# Altium footprint library General.PCBLIB: 231 footprints (part 12 of 15)
Each footprint in its own frame and in the unit in brackets; x right, y up, seen from the top. Pads: shape width x height; smd on the part's side, far side on the other; paste and mask are expansions set on the pad; w line width, h text height; cw(c..) or ccw(c..) is an arc to the next point about the centre after c.
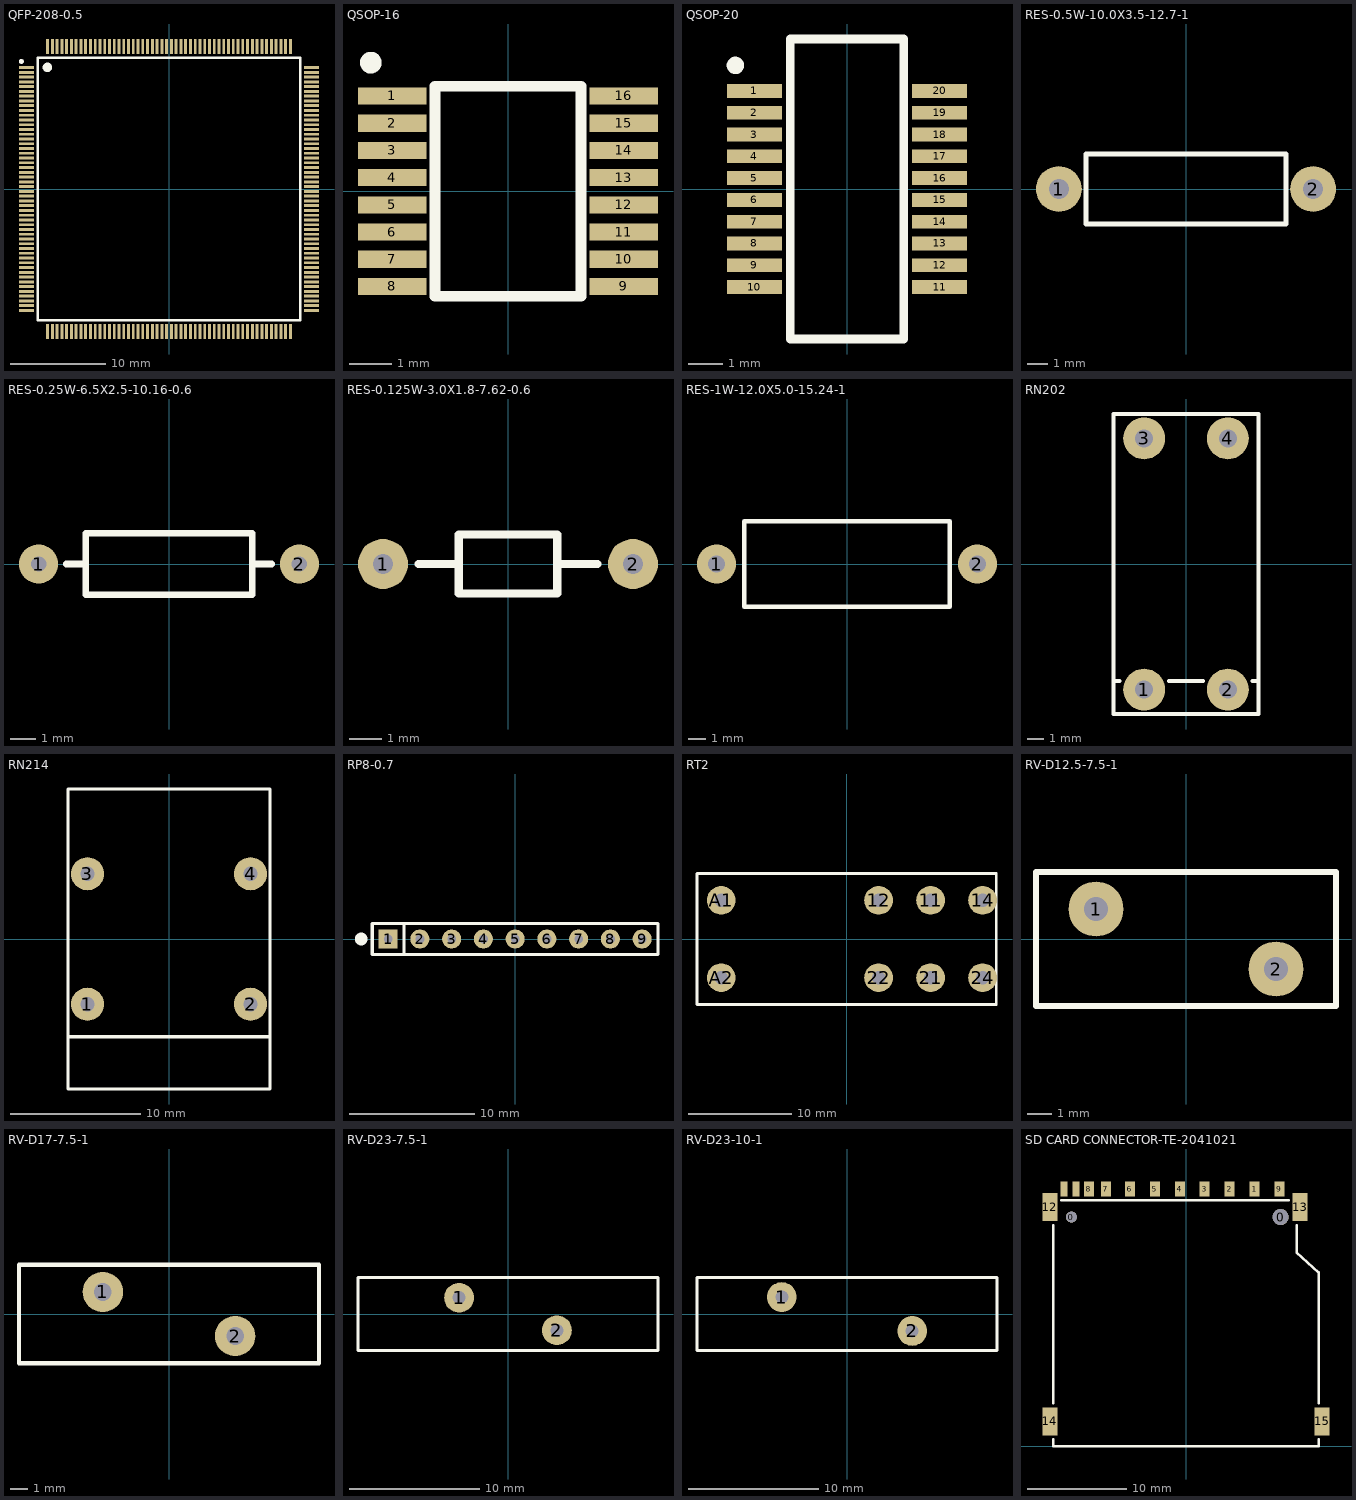
[diagram p11: the footprints below, top view; thin cyan lines are the x and y axes]

## QFP-208-0.5 [mm] "QFP-208"
height 4.1
pads (208):
  rect 1.6x0.3 smd: 1(-14.95,12.75) 2(-14.95,12.25) 3(-14.95,11.75) 4(-14.95,11.25) 5(-14.95,10.75) 6(-14.95,10.25) 7(-14.95,9.75) 8(-14.95,9.25) 9(-14.95,8.75) 10(-14.95,8.25) 11(-14.95,7.75) 12(-14.95,7.25) 13(-14.95,6.75) 14(-14.95,6.25) 15(-14.95,5.75) 16(-14.95,5.25) 17(-14.95,4.75) 18(-14.95,4.25) 19(-14.95,3.75) 20(-14.95,3.25) 21(-14.95,2.75) 22(-14.95,2.25) 23(-14.95,1.75) 24(-14.95,1.25) 25(-14.95,0.75) 26(-14.95,0.25) 27(-14.95,-0.25) 28(-14.95,-0.75) 29(-14.95,-1.25) 30(-14.95,-1.75) 31(-14.95,-2.25) 32(-14.95,-2.75) 33(-14.95,-3.25) 34(-14.95,-3.75) 35(-14.95,-4.25) 36(-14.95,-4.75) 37(-14.95,-5.25) 38(-14.95,-5.75) 39(-14.95,-6.25) 40(-14.95,-6.75) 41(-14.95,-7.25) 42(-14.95,-7.75) 43(-14.95,-8.25) 44(-14.95,-8.75) 45(-14.95,-9.25) 46(-14.95,-9.75) 47(-14.95,-10.25) 48(-14.95,-10.75) 49(-14.95,-11.25) 50(-14.95,-11.75) 51(-14.95,-12.25) 52(-14.95,-12.75) 105(14.95,-12.75) 106(14.95,-12.25) 107(14.95,-11.75) 108(14.95,-11.25) 109(14.95,-10.75) 110(14.95,-10.25) 111(14.95,-9.75) 112(14.95,-9.25) 113(14.95,-8.75) 114(14.95,-8.25) 115(14.95,-7.75) 116(14.95,-7.25) 117(14.95,-6.75) 118(14.95,-6.25) 119(14.95,-5.75) 120(14.95,-5.25) 121(14.95,-4.75) 122(14.95,-4.25) 123(14.95,-3.75) 124(14.95,-3.25) 125(14.95,-2.75) 126(14.95,-2.25) 127(14.95,-1.75) 128(14.95,-1.25) 129(14.95,-0.75) 130(14.95,-0.25) 131(14.95,0.25) 132(14.95,0.75) 133(14.95,1.25) 134(14.95,1.75) 135(14.95,2.25) 136(14.95,2.75) 137(14.95,3.25) 138(14.95,3.75) 139(14.95,4.25) 140(14.95,4.75) 141(14.95,5.25) 142(14.95,5.75) 143(14.95,6.25) 144(14.95,6.75) 145(14.95,7.25) 146(14.95,7.75) 147(14.95,8.25) 148(14.95,8.75) 149(14.95,9.25) 150(14.95,9.75) 151(14.95,10.25) 152(14.95,10.75) 153(14.95,11.25) 154(14.95,11.75) 155(14.95,12.25) 156(14.95,12.75)
  rect 0.3x1.6 smd: 53(-12.75,-14.95) 54(-12.25,-14.95) 55(-11.75,-14.95) 56(-11.25,-14.95) 57(-10.75,-14.95) 58(-10.25,-14.95) 59(-9.75,-14.95) 60(-9.25,-14.95) 61(-8.75,-14.95) 62(-8.25,-14.95) 63(-7.75,-14.95) 64(-7.25,-14.95) 65(-6.75,-14.95) 66(-6.25,-14.95) 67(-5.75,-14.95) 68(-5.25,-14.95) 69(-4.75,-14.95) 70(-4.25,-14.95) 71(-3.75,-14.95) 72(-3.25,-14.95) 73(-2.75,-14.95) 74(-2.25,-14.95) 75(-1.75,-14.95) 76(-1.25,-14.95) 77(-0.75,-14.95) 78(-0.25,-14.95) 79(0.25,-14.95) 80(0.75,-14.95) 81(1.25,-14.95) 82(1.75,-14.95) 83(2.25,-14.95) 84(2.75,-14.95) 85(3.25,-14.95) 86(3.75,-14.95) 87(4.25,-14.95) 88(4.75,-14.95) 89(5.25,-14.95) 90(5.75,-14.95) 91(6.25,-14.95) 92(6.75,-14.95) 93(7.25,-14.95) 94(7.75,-14.95) 95(8.25,-14.95) 96(8.75,-14.95) 97(9.25,-14.95) 98(9.75,-14.95) 99(10.25,-14.95) 100(10.75,-14.95) 101(11.25,-14.95) 102(11.75,-14.95) 103(12.25,-14.95) 104(12.75,-14.95) 157(12.75,14.95) 158(12.25,14.95) 159(11.75,14.95) 160(11.25,14.95) 161(10.75,14.95) 162(10.25,14.95) 163(9.75,14.95) 164(9.25,14.95) 165(8.75,14.95) 166(8.25,14.95) 167(7.75,14.95) 168(7.25,14.95) 169(6.75,14.95) 170(6.25,14.95) 171(5.75,14.95) 172(5.25,14.95) 173(4.75,14.95) 174(4.25,14.95) 175(3.75,14.95) 176(3.25,14.95) 177(2.75,14.95) 178(2.25,14.95) 179(1.75,14.95) 180(1.25,14.95) 181(0.75,14.95) 182(0.25,14.95) 183(-0.25,14.95) 184(-0.75,14.95) 185(-1.25,14.95) 186(-1.75,14.95) 187(-2.25,14.95) 188(-2.75,14.95) 189(-3.25,14.95) 190(-3.75,14.95) 191(-4.25,14.95) 192(-4.75,14.95) 193(-5.25,14.95) 194(-5.75,14.95) 195(-6.25,14.95) 196(-6.75,14.95) 197(-7.25,14.95) 198(-7.75,14.95) 199(-8.25,14.95) 200(-8.75,14.95) 201(-9.25,14.95) 202(-9.75,14.95) 203(-10.25,14.95) 204(-10.75,14.95) 205(-11.25,14.95) 206(-11.75,14.95) 207(-12.25,14.95) 208(-12.75,14.95)
Top Overlay:
  circle w0.254: c-15.5,13.4 r0.127
  circle w0.5: c-12.77,12.77 r0.25
  lines w0.254: -13.77,-13.77 13.77,-13.77 13.77,13.77 -13.77,13.77 -13.77,-13.77
3D body "QFP50P3060X3060X410-208N.STEP": height 4.25, standoff 0, extent -15.315,-15.315 15.313,15.313

## QSOP-16 [mm] "QSOP, 16PIN"
height 1.75
pads (16):
  rect 1.6x0.4 smd: 1(-2.7,2.222) 2(-2.7,1.587) 3(-2.7,0.953) 4(-2.7,0.318) 5(-2.7,-0.318) 6(-2.7,-0.953) 7(-2.7,-1.587) 8(-2.7,-2.222) 9(2.7,-2.222) 10(2.7,-1.587) 11(2.7,-0.953) 12(2.7,-0.318) 13(2.7,0.318) 14(2.7,0.953) 15(2.7,1.587) 16(2.7,2.222)
Top Overlay:
  circle w0.254: c-3.2,3 r0.127
  lines w0.254: -1.7,-2.45 -1.7,2.45 1.7,2.45 1.7,-2.45 -1.7,-2.45
3D body "SOP63P602X173-16N_MO-137AB_QSOP.step": height 1.88, standoff 0, extent -3.038,-2.5 3.038,2.5

## QSOP-20 [mm] "QSOP, 20PIN"
height 1.75
pads (20):
  rect 1.6x0.4 smd: 1(-2.7,2.857) 2(-2.7,2.222) 3(-2.7,1.587) 4(-2.7,0.953) 5(-2.7,0.318) 6(-2.7,-0.318) 7(-2.7,-0.953) 8(-2.7,-1.587) 9(-2.7,-2.222) 10(-2.7,-2.857) 11(2.7,-2.857) 12(2.7,-2.222) 13(2.7,-1.587) 14(2.7,-0.953) 15(2.7,-0.318) 16(2.7,0.318) 17(2.7,0.953) 18(2.7,1.587) 19(2.7,2.222) 20(2.7,2.857)
Top Overlay:
  circle w0.254: c-3.25,3.6 r0.127
  lines w0.254: -1.65,-4.37 -1.65,4.37 1.65,4.37 1.65,-4.37 -1.65,-4.37
3D body "SOP63P602X173-20N_MO-137AD_QSOP.step": height 1.88, standoff 0, extent -3.038,-4.375 3.038,4.375

## RES-0.5W-10.0X3.5-12.7-1 [mil] "Resistor, 0.5W"
height 137.8
pads (2):
  round 90 hole 39.37: 1(-250,0) 2(250,0)
Top Overlay:
  lines w10: -196.85,-68.9 -196.85,68.9 196.85,68.9 196.85,-68.9 -196.85,-68.9
3D body "RES0.5W 600mils.STEP": height 137.8, standoff -118.11, extent -260.63,-68.9 260.63,68.9

## RES-0.25W-6.5X2.5-10.16-0.6 [mil] "Resistor, 0.25W"
height 94.49
pads (2):
  round 60 hole 23.62: 1(-200,0) 2(200,0)
Top Overlay:
  lines w10: -157.48,0 -127.95,0 ; 127.95,0 157.48,0 ; -127.95,-47.24 -127.95,47.24 127.95,47.24 127.95,-47.24 -127.95,-47.24
3D body "RES 400mils.STEP": height 91.88, standoff -123.62, extent -212.01,-45.47 211.99,45.53

## RES-0.125W-3.0X1.8-7.62-0.6 [mil] "Resistor, 0.125W"
height 70.87
pads (2):
  round 60 hole 23.62: 1(-150,0) 2(150,0)
Top Overlay:
  lines w10: -107.48,0 -59.06,0 ; 59.06,0 107.48,0 ; -59.06,-35.43 59.06,-35.43 59.06,35.43 -59.06,35.43 -59.06,-35.43
3D body "RES 300mils.STEP": height 71.65, standoff -160.63, extent -157.87,-35.43 157.09,35.43

## RES-1W-12.0X5.0-15.24-1 [mil] "Resistor, 1W"
height 196.85
pads (2):
  round 90 hole 39.37: 1(-300,0) 2(300,0)
Top Overlay:
  lines w10: -236.22,-98.43 236.22,-98.43 236.22,98.43 -236.22,98.43 -236.22,-98.43
3D body "RES1W 600mils.STEP": height 196.85, standoff -118.11, extent -313.78,-98.43 313.78,98.43

## RN202 [mm] "SCHAFFNER Chock"
height 13.5
pads (4):
  round 2.54 hole 1.1: 1(-2.54,-7.62) 2(2.54,-7.62) 3(-2.54,7.62) 4(2.54,7.62)
Top Overlay:
  lines w0.254: -4.4,-7.1 -4.04,-7.1 ; -1.04,-7.1 1.04,-7.1 ; 4.04,-7.1 4.4,-7.1 ; -4.4,-9.1 -4.4,9.1 4.4,9.1 4.4,-9.1 -4.4,-9.1
3D body: height 23.81, standoff 0, extent -4.4,-9.1 4.4,9.1

## RN214 [mm] "SCHAFFNER Chock"
height 25
pads (4):
  round 2.54 hole 1.1: 1(-6.25,-5) 2(6.25,-5) 3(-6.25,5) 4(6.25,5)
Top Overlay:
  lines w0.254: -7.75,-7.5 7.75,-7.5 ; -7.75,-11.5 7.75,-11.5 7.75,11.5 -7.75,11.5 -7.75,-11.5
3D body: height 25, standoff 0, extent -7.75,-11.5 7.75,11.5

## RP8-0.7 [mil] "Resistor Pack 8"
height 236.22
pads (9):
  rect 60x60 hole 27.56: 1(-400,0)
  round 60 hole 27.56: 2(-300,0) 3(-200,0) 4(-100,0) 5(0,0) 6(100,0) 7(200,0) 8(300,0) 9(400,0)
Top Overlay:
  circle w20: c-485,0 r10
  lines w10: -350,-49.21 -350,49.21 ; -450,-49.21 -450,49.21 450,49.21 450,-49.21 -450,-49.21
3D body "RP-8.STEP": height 198.82, standoff -135.83, extent -442.91,-24.61 442.91,24.61

## RT2 [mm] "Relay, TE"
height 16.2
pads (8):
  round 2.794 hole 1.3: 11(8.15,3.75) 12(3.11,3.75) 14(13.19,3.75) 21(8.15,-3.75) 22(3.11,-3.75) 24(13.19,-3.75) A1(-12.15,3.75) A2(-12.15,-3.75)
Top Overlay:
  lines w0.254: -14.5,-6.35 14.5,-6.35 14.5,6.35 -14.5,6.35 -14.5,-6.35
3D body "RELAY-TE-RT1.STEP": height 15.5, standoff -4, extent -14.5,-6.25 14.5,6.25

## RV-D12.5-7.5-1 [mm] "Varistor, 10mm"
height 16
pads (2):
  round 2.286 hole 1: 1(-3.75,1.25) 2(3.75,-1.25)
Top Overlay:
  lines w0.254: -6.25,-2.8 -6.25,2.8 6.25,2.8 6.25,-2.8 -6.25,-2.8
3D body "VARISTOR-10mm.step": height 16, standoff -3, extent -6.25,-2.8 6.25,2.8

## RV-D17-7.5-1 [mm] "Varistor, 14mm"
height 20
pads (2):
  round 2.286 hole 1: 1(-3.75,1.25) 2(3.75,-1.25)
Top Overlay:
  lines w0.254: -8.5,-2.8 8.5,-2.8 8.5,2.8 -8.5,2.8 -8.5,-2.8
3D body "VARISTOR-14mm.step": height 20, standoff -3, extent -8.5,-2.8 8.499,2.8

## RV-D23-7.5-1 [mm] "Varistor, 20mm"
height 26.5
pads (2):
  round 2.286 hole 1: 1(-3.75,1.25) 2(3.75,-1.25)
Top Overlay:
  lines w0.254: -11.5,-2.8 -11.5,2.8 11.5,2.8 11.5,-2.8 -11.5,-2.8
3D body "VARISTOR-20mm.step": height 26.5, standoff -3, extent -11.5,-2.8 11.5,2.8

## RV-D23-10-1 [mm] "Varistor, 20mm"
height 26.5
pads (2):
  round 2.286 hole 1: 1(-5,1.3) 2(5,-1.3)
Top Overlay:
  lines w0.254: -11.5,-2.8 11.5,-2.8 11.5,2.8 -11.5,2.8 -11.5,-2.8
3D body "VARISTOR-20mm-2.STEP": height 24.7, standoff -2.79, extent -10.756,-2.898 10.744,2.9

## SD CARD CONNECTOR-TE-2041021 [mm] "SD Card Connector, TE, 2041021"
height 3.3
pads (17):
  round 1.1 hole 1.1 unplated: 0(-11.5,23)
  round 1.6 hole 1.6 unplated: 0(9.5,23)
  rect 1x1.5 smd: 1(6.875,25.8) 2(4.375,25.8) 3(1.875,25.8) 4(-0.625,25.8) 5(-3.125,25.8) 6(-5.625,25.8) 7(-8.05,25.8) 8(-9.75,25.8) 9(9.375,25.8)
  rect 0.7x1.5 smd: 10(-11.05,25.8) 11(-12.25,25.8)
  rect 1.5x2.8 smd: 12(-13.65,24) 13(11.45,24) 14(-13.65,2.5) 15(13.65,2.5)
Top Overlay:
  lines w0.254: -13.3,0.7 -13.3,0 13.3,0 13.3,0.7 ; -13.3,4.3 -13.3,22.2 ; -12.5,24.67 10.3,24.67 ; 11.1,22.2 11.1,19.44 13.3,17.44 13.3,4.3
3D body "SD_Card_Connector-TE-2041021.STEP": height 3.3, standoff -0.6, extent -14.025,0 13.95,26.25